# Altium footprint library Package_SO.PcbLib: 333 footprints (part 7 of 21)
Each footprint in its own frame and in the unit in brackets; x right, y up, seen from the top. Pads: shape width x height; smd on the part's side, far side on the other; paste and mask are expansions set on the pad; w line width, h text height; cw(c..) or ccw(c..) is an arc to the next point about the centre after c.
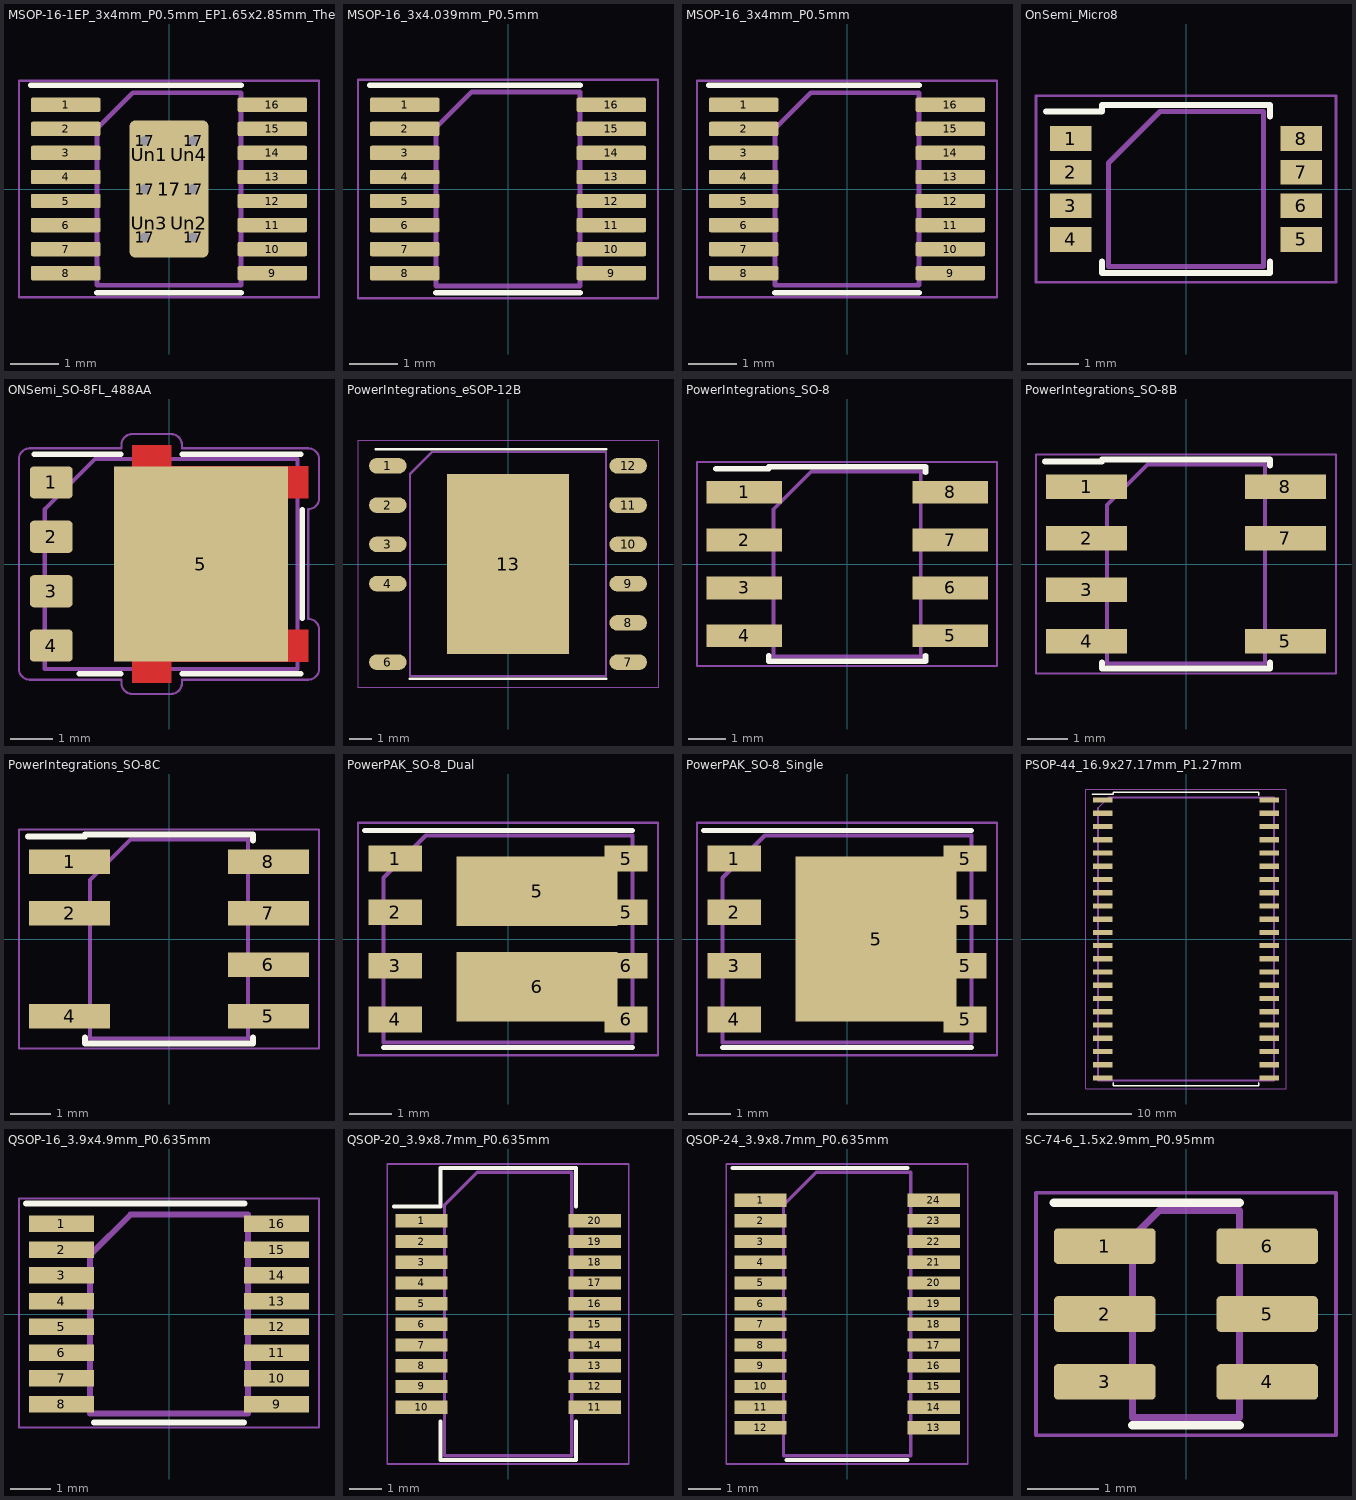
[diagram p6: the footprints below, top view; thin cyan lines are the x and y axes]

## MSOP-16-1EP_3x4mm_P0.5mm_EP1.65x2.85mm_ThermalVias [mm]
pads (28):
  rrect25% 1.45x0.3 smd: 1(-2.15,1.75) 2(-2.15,1.25) 3(-2.15,0.75) 4(-2.15,0.25) 5(-2.15,-0.25) 6(-2.15,-0.75) 7(-2.15,-1.25) 8(-2.15,-1.75) 9(2.15,-1.75) 10(2.15,-1.25) 11(2.15,-0.75) 12(2.15,-0.25) 13(2.15,0.25) 14(2.15,0.75) 15(2.15,1.25) 16(2.15,1.75)
  round 0.5 hole 0.2: 17(-0.5,-1) 17(-0.5,0) 17(-0.5,1) 17(0.5,-1) 17(0.5,0) 17(0.5,1)
  rrect15% 1.65x2.85 smd: 17(0,0)
  rrect17% 1.5x2.5 smd far side: 17(0,0)
  rrect25% 0.69x1.19 on Top Paste: Un1(-0.41,0.71) Un2(0.41,-0.71) Un3(-0.41,-0.71) Un4(0.41,0.71)
F.SilkS:
  lines w0.12: -2.875,2.16 0,2.16 1.5,2.16 ; -1.5,-2.16 0,-2.16 1.5,-2.16
F.CrtYd:
  lines w0.05: -3.12,-2.25 -3.12,2.25 3.12,2.25 3.12,-2.25 -3.12,-2.25
F.Fab:
  lines w0.1: -1.5,-2 -1.5,1.25 -0.75,2 1.5,2 1.5,-2 -1.5,-2
  text "'.Designator'" at -3.033,-0.628 h0.75

## MSOP-16_3x4.039mm_P0.5mm [mm]
pads (16):
  rrect25% 1.45x0.3 smd: 1(-2.15,1.75) 2(-2.15,1.25) 3(-2.15,0.75) 4(-2.15,0.25) 5(-2.15,-0.25) 6(-2.15,-0.75) 7(-2.15,-1.25) 8(-2.15,-1.75) 9(2.15,-1.75) 10(2.15,-1.25) 11(2.15,-0.75) 12(2.15,-0.25) 13(2.15,0.25) 14(2.15,0.75) 15(2.15,1.25) 16(2.15,1.75)
F.SilkS:
  lines w0.12: -2.875,2.16 0,2.16 1.5,2.16 ; -1.5,-2.16 0,-2.16 1.5,-2.16
F.CrtYd:
  lines w0.05: -3.12,-2.27 -3.12,2.27 3.12,2.27 3.12,-2.27 -3.12,-2.27
F.Fab:
  lines w0.1: -1.5,-2.02 1.5,-2.02 1.5,2.02 -0.75,2.02 -1.5,1.269 -1.5,-2.02
  text "'.Designator'" at -3.033,-0.628 h0.75

## MSOP-16_3x4mm_P0.5mm [mm]
pads (16):
  rrect25% 1.45x0.3 smd: 1(-2.15,1.75) 2(-2.15,1.25) 3(-2.15,0.75) 4(-2.15,0.25) 5(-2.15,-0.25) 6(-2.15,-0.75) 7(-2.15,-1.25) 8(-2.15,-1.75) 9(2.15,-1.75) 10(2.15,-1.25) 11(2.15,-0.75) 12(2.15,-0.25) 13(2.15,0.25) 14(2.15,0.75) 15(2.15,1.25) 16(2.15,1.75)
F.SilkS:
  lines w0.12: -2.875,2.16 0,2.16 1.5,2.16 ; -1.5,-2.16 0,-2.16 1.5,-2.16
F.CrtYd:
  lines w0.05: -3.12,-2.25 3.12,-2.25 3.12,2.25 -3.12,2.25 -3.12,-2.25
F.Fab:
  lines w0.1: -1.5,-2 1.5,-2 1.5,2 -0.75,2 -1.5,1.25 -1.5,-2
  text "'.Designator'" at -3.033,-0.628 h0.75

## OnSemi_Micro8 [mm]
pads (8):
  rect 0.8x0.48 smd: 1(-2.225,0.975) 2(-2.225,0.325) 3(-2.225,-0.325) 4(-2.225,-0.975) 5(2.225,-0.975) 6(2.225,-0.325) 7(2.225,0.325) 8(2.225,0.975)
F.SilkS:
  lines w0.12: -2.7,1.5 -1.625,1.5 -1.625,1.625 1.625,1.625 1.625,1.4 ; -1.625,-1.4 -1.625,-1.625 1.625,-1.625 1.625,-1.4
F.CrtYd:
  lines w0.05: -2.9,-1.8 2.9,-1.8 2.9,1.8 -2.9,1.8 -2.9,-1.8
F.Fab:
  lines w0.1: -1.5,-1.5 1.5,-1.5 1.5,1.5 -0.5,1.5 -1.5,0.5 -1.5,-1.5
  text "'.Designator'" at -2.828,-0.583 h0.7

## ONSemi_SO-8FL_488AA [mm]
pads (5):
  rrect25% 1x0.75 smd: 1(-2.747,1.905) 2(-2.747,0.635) 3(-2.747,-0.635) 4(-2.747,-1.905)
  rect 4.055x4.56 smd: 5(0.745,0)
F.Cu:
  region: 0.048,2.28 3.247,2.28 3.247,1.53 2.65,1.53 2.65,-1.53 3.247,-1.53 3.247,-2.28 0.048,-2.28 0.048,-2.775 -0.858,-2.775 -0.858,2.775 0.048,2.775
F.SilkS:
  lines w0.12: -3.152,2.56 -1.118,2.56 ; -2.103,-2.56 -1.118,-2.56 ; 0.308,-2.56 3.078,-2.56 ; 0.308,2.56 3.078,2.56 ; 3.108,-1.27 3.108,1.27
F.Paste:
  region: 0.048,2.28 3.247,2.28 3.247,1.53 2.65,1.53 2.65,-1.53 3.247,-1.53 3.247,-2.28 0.048,-2.28 0.048,-2.775 -0.858,-2.775 -0.858,2.775 0.048,2.775
F.Mask:
  region: 0.048,2.28 3.247,2.28 3.247,1.53 2.65,1.53 2.65,-1.53 3.247,-1.53 3.247,-2.28 0.048,-2.28 0.048,-2.775 -0.858,-2.775 -0.858,2.775 0.048,2.775
F.CrtYd:
  lines w0.05: -3.5,-2.45 -3.5,2.45 cw(c-3.25,2.45) -3.25,2.7 -1.11,2.7 -1.11,2.78 cw(c-0.86,2.78) -0.86,3.03 0.05,3.03 cw(c0.05,2.78) 0.3,2.78 0.3,2.7 3.25,2.7 cw(c3.25,2.45) 3.5,2.45 3.5,1.53 cw(c3.25,1.53) 3.25,1.28 3.25,-1.28 cw(c3.25,-1.53) 3.5,-1.53 3.5,-2.45 cw(c3.25,-2.45) 3.25,-2.7 0.3,-2.7 0.3,-2.78 cw(c0.05,-2.78) 0.05,-3.03 -0.86,-3.03 cw(c-0.86,-2.78) -1.11,-2.78 -1.11,-2.7 -3.25,-2.7 cw(c-3.25,-2.45) -3.5,-2.45
F.Fab:
  lines w0.1: -2.902,-2.45 2.998,-2.45 2.998,2.45 -1.727,2.45 -2.902,1.275 -2.902,-2.45
  text "'.Designator'" at -3.999,-0.84 h1

## PowerIntegrations_eSOP-12B [mm]
pads (12):
  rrect100% 1.7x0.71 smd: 1(-5.45,4.45) 2(-5.45,2.67) 3(-5.45,0.89) 4(-5.45,-0.89) 6(-5.45,-4.45) 7(5.45,-4.45) 8(5.45,-2.67) 9(5.45,-0.89) 10(5.45,0.89) 11(5.45,2.67) 12(5.45,4.45)
  rect 5.51x8.15 smd: 13(0,0)
F.SilkS:
  lines w0.12: -6,5.2 4.445,5.2 ; -4.445,-5.2 4.445,-5.2
F.CrtYd:
  lines w0.05: -6.8,-5.6 6.8,-5.6 6.8,5.6 -6.8,5.6 -6.8,-5.6
F.Fab:
  lines w0.1: -4.445,-5.08 -4.445,4.08 -3.445,5.08 4.445,5.08 4.445,-5.08 -4.445,-5.08
  text "'.Designator'" at -4.047,-0.84 h1

## PowerIntegrations_SO-8 [mm]
pads (8):
  rect 2x0.6 smd: 1(-2.725,1.905) 2(-2.725,0.635) 3(-2.725,-0.635) 4(-2.725,-1.905) 5(2.725,-1.905) 6(2.725,-0.635) 7(2.725,0.635) 8(2.725,1.905)
F.SilkS:
  lines w0.15: -3.475,2.525 -2.075,2.525 -2.075,2.575 2.075,2.575 2.075,2.43 ; -2.075,-2.43 -2.075,-2.575 2.075,-2.575 2.075,-2.43
F.CrtYd:
  lines w0.05: -3.98,-2.7 -3.98,2.7 3.97,2.7 3.97,-2.7 -3.98,-2.7
F.Fab:
  lines w0.1: -1.95,-2.45 -1.95,1.45 -0.95,2.45 1.95,2.45 1.95,-2.45 -1.95,-2.45
  text "'.Designator'" at -4.047,-0.84 h1

## PowerIntegrations_SO-8B [mm]
pads (7):
  rect 2x0.6 smd: 1(-2.45,1.905) 2(-2.45,0.635) 3(-2.45,-0.635) 4(-2.45,-1.905) 5(2.45,-1.905) 7(2.45,0.635) 8(2.45,1.905)
F.SilkS:
  lines w0.15: -3.475,2.525 -2.075,2.525 -2.075,2.575 2.075,2.575 2.075,2.43 ; -2.075,-2.43 -2.075,-2.575 2.075,-2.575 2.075,-2.43
F.CrtYd:
  lines w0.05: -3.7,-2.7 -3.7,2.7 3.7,2.7 3.7,-2.7 -3.7,-2.7
F.Fab:
  lines w0.1: -1.95,-2.45 1.95,-2.45 1.95,2.45 -0.95,2.45 -1.95,1.45 -1.95,-2.45
  text "'.Designator'" at -4.047,-0.84 h1

## PowerIntegrations_SO-8C [mm]
pads (7):
  rect 2x0.6 smd: 1(-2.45,1.905) 2(-2.45,0.635) 4(-2.45,-1.905) 5(2.45,-1.905) 6(2.45,-0.635) 7(2.45,0.635) 8(2.45,1.905)
F.SilkS:
  lines w0.15: -3.475,2.525 -2.075,2.525 -2.075,2.575 2.075,2.575 2.075,2.43 ; -2.075,-2.43 -2.075,-2.575 2.075,-2.575 2.075,-2.43
F.CrtYd:
  lines w0.05: -3.7,-2.7 3.7,-2.7 3.7,2.7 -3.7,2.7 -3.7,-2.7
F.Fab:
  lines w0.1: -1.95,-2.45 -1.95,1.45 -0.95,2.45 1.95,2.45 1.95,-2.45 -1.95,-2.45
  text "'.Designator'" at -4.047,-0.84 h1

## PowerPAK_SO-8_Dual [mm]
pads (10):
  rect 1.27x0.61 smd: 1(-2.67,1.905) 2(-2.67,0.635) 3(-2.67,-0.635) 4(-2.67,-1.905)
  rect 3.81x1.65 smd: 5(0.69,1.13) 6(0.69,-1.13)
  rect 1.02x0.61 smd: 5(2.795,0.635) 5(2.795,1.905) 6(2.795,-1.905) 6(2.795,-0.635)
F.SilkS:
  lines w0.12: -3.4,2.57 2.945,2.57 ; -2.945,-2.57 2.945,-2.57
F.CrtYd:
  lines w0.05: -3.55,-2.75 3.55,-2.75 3.55,2.75 -3.55,2.75 -3.55,-2.75
F.Fab:
  lines w0.1: -2.945,-2.45 2.945,-2.45 2.945,2.45 -1.945,2.45 -2.945,1.45 -2.945,-2.45
  text "'.Designator'" at -4.047,-0.84 h1

## PowerPAK_SO-8_Single [mm]
pads (9):
  rect 1.27x0.61 smd: 1(-2.67,1.905) 2(-2.67,0.635) 3(-2.67,-0.635) 4(-2.67,-1.905)
  rect 3.81x3.91 smd: 5(0.69,0)
  rect 1.02x0.61 smd: 5(2.795,-1.905) 5(2.795,-0.635) 5(2.795,0.635) 5(2.795,1.905)
F.SilkS:
  lines w0.12: -3.4,2.57 2.945,2.57 ; -2.945,-2.57 2.945,-2.57
F.CrtYd:
  lines w0.05: -3.55,-2.75 -3.55,2.75 3.55,2.75 3.55,-2.75 -3.55,-2.75
F.Fab:
  lines w0.1: -2.945,-2.45 -2.945,1.45 -1.945,2.45 2.945,2.45 2.945,-2.45 -2.945,-2.45
  text "'.Designator'" at -4.047,-0.84 h1

## PSOP-44_16.9x27.17mm_P1.27mm [mm]
pads (44):
  rect 1.9x0.5 smd: 1(-8,13.335) 2(-8,12.065) 3(-8,10.795) 4(-8,9.525) 5(-8,8.255) 6(-8,6.985) 7(-8,5.715) 8(-8,4.445) 9(-8,3.175) 10(-8,1.905) 11(-8,0.635) 12(-8,-0.635) 13(-8,-1.905) 14(-8,-3.175) 15(-8,-4.445) 16(-8,-5.715) 17(-8,-6.985) 18(-8,-8.255) 19(-8,-9.525) 20(-8,-10.795) 21(-8,-12.065) 22(-8,-13.335) 23(8,-13.335) 24(8,-12.065) 25(8,-10.795) 26(8,-9.525) 27(8,-8.255) 28(8,-6.985) 29(8,-5.715) 30(8,-4.445) 31(8,-3.175) 32(8,-1.905) 33(8,-0.635) 34(8,0.635) 35(8,1.905) 36(8,3.175) 37(8,4.445) 38(8,5.715) 39(8,6.985) 40(8,8.255) 41(8,9.525) 42(8,10.795) 43(8,12.065) 44(8,13.335)
F.SilkS:
  lines w0.15: -9,13.9 -7,13.9 -7,14.1 7,14.1 7,13.8 ; -7,-13.8 -7,-14.1 7,-14.1 7,-13.8
F.CrtYd:
  lines w0.05: -9.6,-14.4 -9.6,14.4 9.6,14.4 9.6,-14.4 -9.6,-14.4
F.Fab:
  lines w0.15: -8.45,-13.585 8.45,-13.585 8.45,13.585 -7.45,13.585 -8.45,12.585 -8.45,-13.585
  text "'.Designator'" at -3.267,-0.702 h0.8

## QSOP-16_3.9x4.9mm_P0.635mm [mm]
pads (16):
  rect 1.6x0.41 smd: 1(-2.654,2.222) 2(-2.654,1.587) 3(-2.654,0.953) 4(-2.654,0.318) 5(-2.654,-0.318) 6(-2.654,-0.953) 7(-2.654,-1.587) 8(-2.654,-2.222) 9(2.654,-2.222) 10(2.654,-1.587) 11(2.654,-0.953) 12(2.654,-0.318) 13(2.654,0.318) 14(2.654,0.953) 15(2.654,1.587) 16(2.654,2.222)
F.SilkS:
  lines w0.15: -3.525,2.725 1.859,2.725 ; -1.854,-2.675 1.854,-2.675
F.CrtYd:
  lines w0.05: -3.7,-2.8 3.7,-2.8 3.7,2.85 -3.7,2.85 -3.7,-2.8
F.Fab:
  lines w0.15: -1.95,-2.45 -1.95,1.45 -0.95,2.45 1.95,2.45 1.95,-2.45 -1.95,-2.45
  text "'.Designator'" at -2.728,-0.25 h0.7

## QSOP-20_3.9x8.7mm_P0.635mm [mm]
pads (20):
  rect 1.6x0.41 smd: 1(-2.654,2.857) 2(-2.654,2.222) 3(-2.654,1.587) 4(-2.654,0.953) 5(-2.654,0.318) 6(-2.654,-0.318) 7(-2.654,-0.953) 8(-2.654,-1.587) 9(-2.654,-2.222) 10(-2.654,-2.857) 11(2.654,-2.857) 12(2.654,-2.222) 13(2.654,-1.587) 14(2.654,-0.953) 15(2.654,-0.318) 16(2.654,0.318) 17(2.654,0.953) 18(2.654,1.587) 19(2.654,2.222) 20(2.654,2.857)
F.SilkS:
  lines w0.12: -3.5,3.3 -2.075,3.3 -2.075,4.475 2.075,4.475 2.075,3.3 ; -2.075,-3.3 -2.075,-4.475 2.075,-4.475 2.075,-3.3
F.CrtYd:
  lines w0.05: -3.71,-4.6 3.7,-4.6 3.7,4.6 -3.71,4.6 -3.71,-4.6
F.Fab:
  lines w0.1: -1.95,-4.35 1.95,-4.35 1.95,4.35 -0.95,4.35 -1.95,3.35 -1.95,-4.35
  text "'.Designator'" at -3.117,-0.286 h0.8

## QSOP-24_3.9x8.7mm_P0.635mm [mm]
pads (24):
  rect 1.6x0.41 smd: 1(-2.654,3.492) 2(-2.654,2.857) 3(-2.654,2.222) 4(-2.654,1.587) 5(-2.654,0.953) 6(-2.654,0.318) 7(-2.654,-0.318) 8(-2.654,-0.953) 9(-2.654,-1.587) 10(-2.654,-2.222) 11(-2.654,-2.857) 12(-2.654,-3.492) 13(2.654,-3.492) 14(2.654,-2.857) 15(2.654,-2.222) 16(2.654,-1.587) 17(2.654,-0.953) 18(2.654,-0.318) 19(2.654,0.318) 20(2.654,0.953) 21(2.654,1.587) 22(2.654,2.222) 23(2.654,2.857) 24(2.654,3.492)
F.SilkS:
  lines w0.12: -3.525,4.475 1.859,4.475 ; -1.854,-4.475 1.854,-4.475
F.CrtYd:
  lines w0.05: -3.71,-4.6 3.7,-4.6 3.7,4.6 -3.71,4.6 -3.71,-4.6
F.Fab:
  lines w0.1: -1.95,-4.35 -1.95,3.35 -0.95,4.35 1.95,4.35 1.95,-4.35 -1.95,-4.35
  text "'.Designator'" at -3.117,-0.286 h0.8

## SC-74-6_1.5x2.9mm_P0.95mm [mm]
pads (6):
  rrect25% 1.425x0.5 smd: 1(-1.138,0.95) 2(-1.138,0) 3(-1.138,-0.95) 4(1.138,-0.95) 5(1.138,0) 6(1.138,0.95)
F.SilkS:
  lines w0.12: -1.85,1.56 0,1.56 0.75,1.56 ; -0.75,-1.56 0,-1.56 0.75,-1.56
F.CrtYd:
  lines w0.05: -2.1,-1.7 2.1,-1.7 2.1,1.7 -2.1,1.7 -2.1,-1.7
F.Fab:
  lines w0.1: -0.75,-1.45 -0.75,1.075 -0.375,1.45 0.75,1.45 0.75,-1.45 -0.75,-1.45
  text "'.Designator'" at -1.541,-0.322 h0.38